# Altium footprint library Item_pcb.PcbLib: 282 footprints (part 9 of 18)
Each footprint in its own frame and in the unit in brackets; x right, y up, seen from the top. Pads: shape width x height; smd on the part's side, far side on the other; paste and mask are expansions set on the pad; w line width, h text height; cw(c..) or ccw(c..) is an arc to the next point about the centre after c.
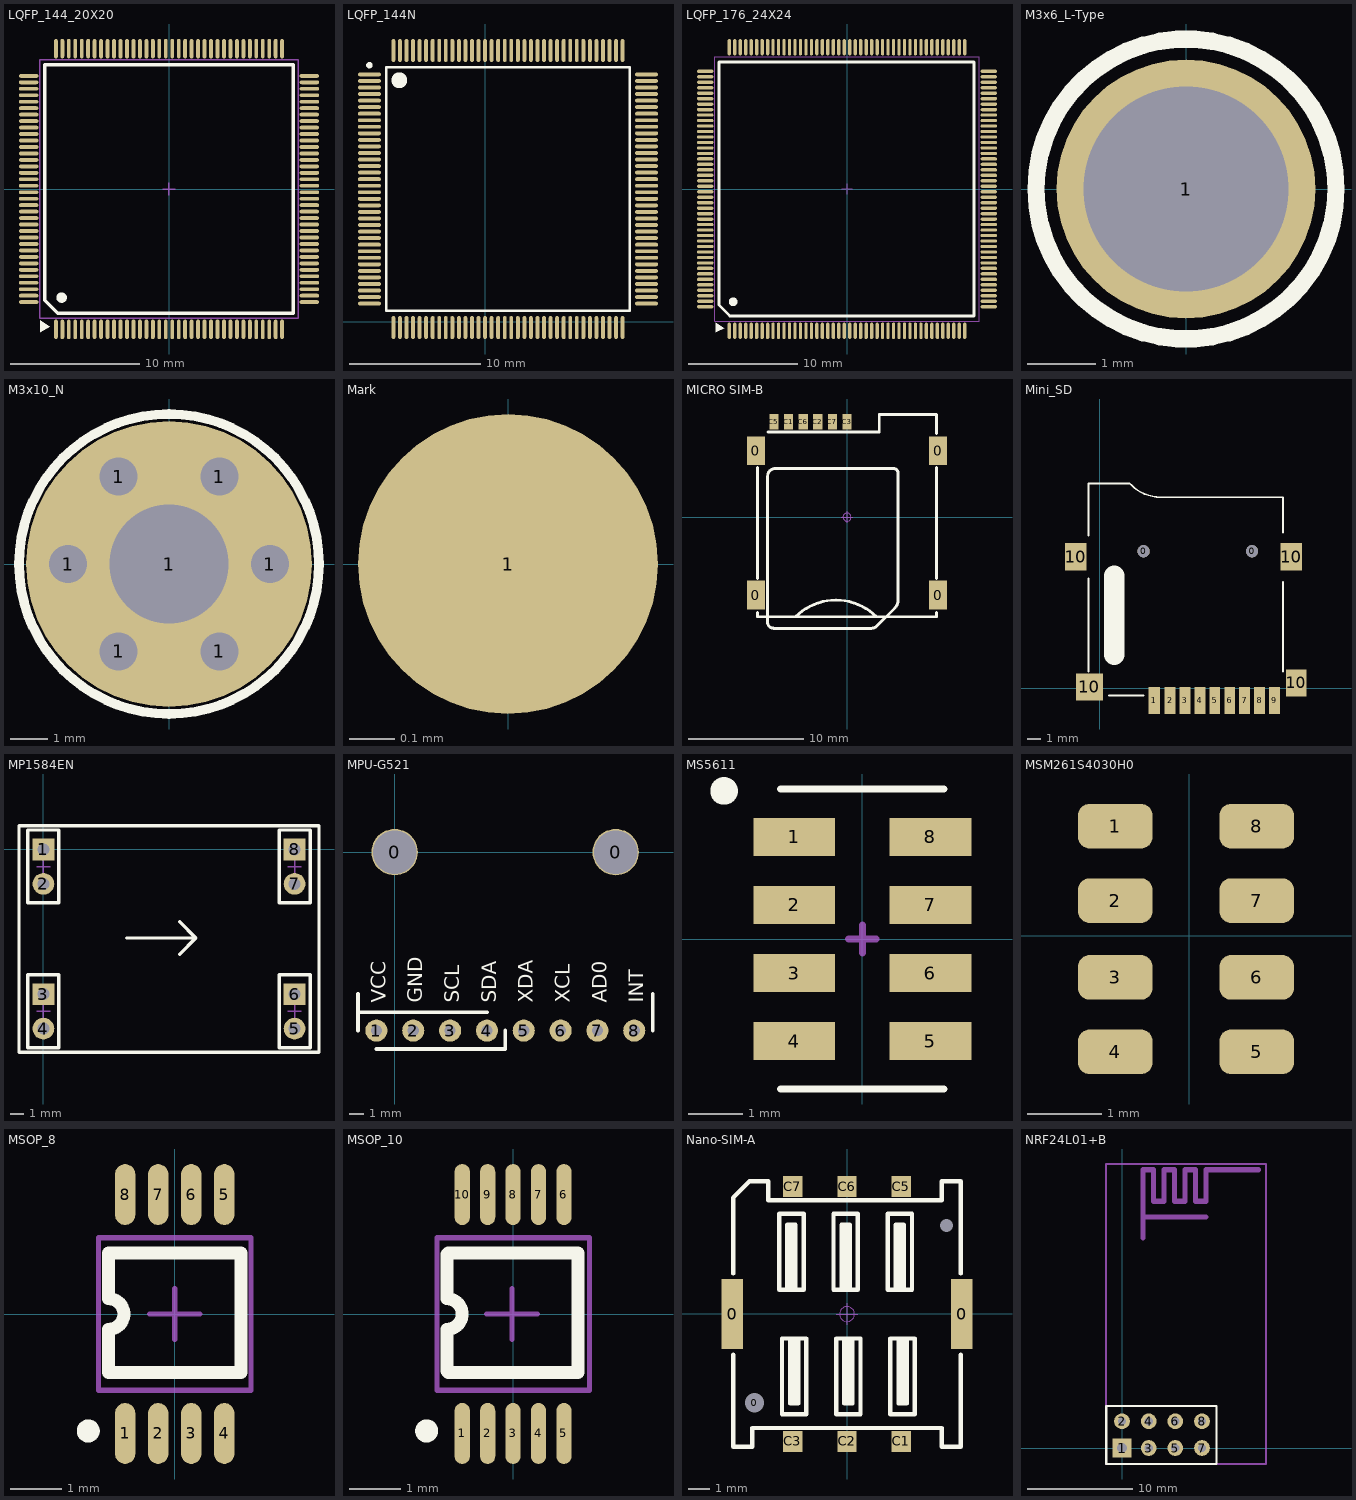
[diagram p8: the footprints below, top view; thin cyan lines are the x and y axes]

## LQFP_144_20X20 [mm]
pads (144):
  oval 0.3x1.5 smd: 1(-8.75,-10.85) 2(-8.25,-10.85) 3(-7.75,-10.85) 4(-7.25,-10.85) 5(-6.75,-10.85) 6(-6.25,-10.85) 7(-5.75,-10.85) 8(-5.25,-10.85) 9(-4.75,-10.85) 10(-4.25,-10.85) 11(-3.75,-10.85) 12(-3.25,-10.85) 13(-2.75,-10.85) 14(-2.25,-10.85) 15(-1.75,-10.85) 16(-1.25,-10.85) 17(-0.75,-10.85) 18(-0.25,-10.85) 19(0.25,-10.85) 20(0.75,-10.85) 21(1.25,-10.85) 22(1.75,-10.85) 23(2.25,-10.85) 24(2.75,-10.85) 25(3.25,-10.85) 26(3.75,-10.85) 27(4.25,-10.85) 28(4.75,-10.85) 29(5.25,-10.85) 30(5.75,-10.85) 31(6.25,-10.85) 32(6.75,-10.85) 33(7.25,-10.85) 34(7.75,-10.85) 35(8.25,-10.85) 36(8.75,-10.85) 73(8.75,10.85) 74(8.25,10.85) 75(7.75,10.85) 76(7.25,10.85) 77(6.75,10.85) 78(6.25,10.85) 79(5.75,10.85) 80(5.25,10.85) 81(4.75,10.85) 82(4.25,10.85) 83(3.75,10.85) 84(3.25,10.85) 85(2.75,10.85) 86(2.25,10.85) 87(1.75,10.85) 88(1.25,10.85) 89(0.75,10.85) 90(0.25,10.85) 91(-0.25,10.85) 92(-0.75,10.85) 93(-1.25,10.85) 94(-1.75,10.85) 95(-2.25,10.85) 96(-2.75,10.85) 97(-3.25,10.85) 98(-3.75,10.85) 99(-4.25,10.85) 100(-4.75,10.85) 101(-5.25,10.85) 102(-5.75,10.85) 103(-6.25,10.85) 104(-6.75,10.85) 105(-7.25,10.85) 106(-7.75,10.85) 107(-8.25,10.85) 108(-8.75,10.85)
  oval 1.5x0.3 smd: 37(10.85,-8.75) 38(10.85,-8.25) 39(10.85,-7.75) 40(10.85,-7.25) 41(10.85,-6.75) 42(10.85,-6.25) 43(10.85,-5.75) 44(10.85,-5.25) 45(10.85,-4.75) 46(10.85,-4.25) 47(10.85,-3.75) 48(10.85,-3.25) 49(10.85,-2.75) 50(10.85,-2.25) 51(10.85,-1.75) 52(10.85,-1.25) 53(10.85,-0.75) 54(10.85,-0.25) 55(10.85,0.25) 56(10.85,0.75) 57(10.85,1.25) 58(10.85,1.75) 59(10.85,2.25) 60(10.85,2.75) 61(10.85,3.25) 62(10.85,3.75) 63(10.85,4.25) 64(10.85,4.75) 65(10.85,5.25) 66(10.85,5.75) 67(10.85,6.25) 68(10.85,6.75) 69(10.85,7.25) 70(10.85,7.75) 71(10.85,8.25) 72(10.85,8.75) 109(-10.85,8.75) 110(-10.85,8.25) 111(-10.85,7.75) 112(-10.85,7.25) 113(-10.85,6.75) 114(-10.85,6.25) 115(-10.85,5.75) 116(-10.85,5.25) 117(-10.85,4.75) 118(-10.85,4.25) 119(-10.85,3.75) 120(-10.85,3.25) 121(-10.85,2.75) 122(-10.85,2.25) 123(-10.85,1.75) 124(-10.85,1.25) 125(-10.85,0.75) 126(-10.85,0.25) 127(-10.85,-0.25) 128(-10.85,-0.75) 129(-10.85,-1.25) 130(-10.85,-1.75) 131(-10.85,-2.25) 132(-10.85,-2.75) 133(-10.85,-3.25) 134(-10.85,-3.75) 135(-10.85,-4.25) 136(-10.85,-4.75) 137(-10.85,-5.25) 138(-10.85,-5.75) 139(-10.85,-6.25) 140(-10.85,-6.75) 141(-10.85,-7.25) 142(-10.85,-7.75) 143(-10.85,-8.25) 144(-10.85,-8.75)
Top Overlay:
  circle w0.4: c-8.3,-8.4 r0.2
  region: -9.225,-10.637 -9.975,-10.162 -9.975,-11.062
  lines w0.254: -9.6,-8.6 -8.6,-9.6 9.6,-9.6 9.6,9.6 -9.6,9.6 -9.6,-8.6
Mechanical 15:
  lines w0.1: -0.5,0 0.5,0 ; 0,-0.5 0,0.5 ; -10,-10 -10,10 10,10 10,-10 -10,-10
3D body "LQFP-144-20x20.STEP": height 1.88, standoff -0.01, extent -11.102,-11.1 11.1,11.102

## LQFP_144N [mm]
pads (144):
  oval 1.75x0.297 smd: 1(-8.82,18.868) 2(-8.82,18.368) 3(-8.82,17.868) 4(-8.82,17.368) 5(-8.82,16.868) 6(-8.82,16.368) 7(-8.82,15.868) 8(-8.82,15.368) 9(-8.82,14.868) 10(-8.82,14.368) 11(-8.82,13.868) 12(-8.82,13.368) 13(-8.82,12.868) 14(-8.82,12.368) 15(-8.82,11.868) 16(-8.82,11.368) 17(-8.82,10.868) 18(-8.82,10.368) 19(-8.82,9.868) 20(-8.82,9.368) 21(-8.82,8.868) 22(-8.82,8.368) 23(-8.82,7.868) 24(-8.82,7.368) 25(-8.82,6.868) 26(-8.82,6.368) 27(-8.82,5.868) 28(-8.82,5.368) 29(-8.82,4.868) 30(-8.82,4.368) 31(-8.82,3.868) 32(-8.82,3.368) 33(-8.82,2.868) 34(-8.82,2.368) 35(-8.82,1.868) 36(-8.82,1.368) 73(12.33,1.368) 74(12.33,1.868) 75(12.33,2.368) 76(12.33,2.868) 77(12.33,3.368) 78(12.33,3.868) 79(12.33,4.368) 80(12.33,4.868) 81(12.33,5.368) 82(12.33,5.868) 83(12.33,6.368) 84(12.33,6.868) 85(12.33,7.368) 86(12.33,7.868) 87(12.33,8.368) 88(12.33,8.868) 89(12.33,9.368) 90(12.33,9.868) 91(12.33,10.368) 92(12.33,10.868) 93(12.33,11.368) 94(12.33,11.868) 95(12.33,12.368) 96(12.33,12.868) 97(12.33,13.368) 98(12.33,13.868) 99(12.33,14.368) 100(12.33,14.868) 101(12.33,15.368) 102(12.33,15.868) 103(12.33,16.368) 104(12.33,16.868) 105(12.33,17.368) 106(12.33,17.868) 107(12.33,18.368) 108(12.33,18.868)
  oval 0.297x1.75 smd: 37(-6.995,-0.457) 38(-6.495,-0.457) 39(-5.995,-0.457) 40(-5.495,-0.457) 41(-4.995,-0.457) 42(-4.495,-0.457) 43(-3.995,-0.457) 44(-3.495,-0.457) 45(-2.995,-0.457) 46(-2.495,-0.457) 47(-1.995,-0.457) 48(-1.495,-0.457) 49(-0.995,-0.457) 50(-0.495,-0.457) 51(0.005,-0.457) 52(0.505,-0.457) 53(1.005,-0.457) 54(1.505,-0.457) 55(2.005,-0.457) 56(2.505,-0.457) 57(3.005,-0.457) 58(3.505,-0.457) 59(4.005,-0.457) 60(4.505,-0.457) 61(5.005,-0.457) 62(5.505,-0.457) 63(6.005,-0.457) 64(6.505,-0.457) 65(7.005,-0.457) 66(7.505,-0.457) 67(8.005,-0.457) 68(8.505,-0.457) 69(9.005,-0.457) 70(9.505,-0.457) 71(10.005,-0.457) 72(10.505,-0.457) 109(10.505,20.693) 110(10.005,20.693) 111(9.505,20.693) 112(9.005,20.693) 113(8.505,20.693) 114(8.005,20.693) 115(7.505,20.693) 116(7.005,20.693) 117(6.505,20.693) 118(6.005,20.693) 119(5.505,20.693) 120(5.005,20.693) 121(4.505,20.693) 122(4.005,20.693) 123(3.505,20.693) 124(3.005,20.693) 125(2.505,20.693) 126(2.005,20.693) 127(1.505,20.693) 128(1.005,20.693) 129(0.505,20.693) 130(0.005,20.693) 131(-0.495,20.693) 132(-0.995,20.693) 133(-1.495,20.693) 134(-1.995,20.693) 135(-2.495,20.693) 136(-2.995,20.693) 137(-3.495,20.693) 138(-3.995,20.693) 139(-4.495,20.693) 140(-4.995,20.693) 141(-5.495,20.693) 142(-5.995,20.693) 143(-6.495,20.693) 144(-6.995,20.693)
Top Overlay:
  circle w0.25: c-8.82,19.568 r0.125
  circle w0.6: c-6.545,18.418 r0.3
  lines w0.2: -7.545,0.818 -7.545,19.418 11.055,19.418 11.055,0.818 -7.545,0.818

## LQFP_176_24X24 [mm]
pads (176):
  oval 0.3x1.5 smd: 1(-10.75,-12.95) 2(-10.25,-12.95) 3(-9.75,-12.95) 4(-9.25,-12.95) 5(-8.75,-12.95) 6(-8.25,-12.95) 7(-7.75,-12.95) 8(-7.25,-12.95) 9(-6.75,-12.95) 10(-6.25,-12.95) 11(-5.75,-12.95) 12(-5.25,-12.95) 13(-4.75,-12.95) 14(-4.25,-12.95) 15(-3.75,-12.95) 16(-3.25,-12.95) 17(-2.75,-12.95) 18(-2.25,-12.95) 19(-1.75,-12.95) 20(-1.25,-12.95) 21(-0.75,-12.95) 22(-0.25,-12.95) 23(0.25,-12.95) 24(0.75,-12.95) 25(1.25,-12.95) 26(1.75,-12.95) 27(2.25,-12.95) 28(2.75,-12.95) 29(3.25,-12.95) 30(3.75,-12.95) 31(4.25,-12.95) 32(4.75,-12.95) 33(5.25,-12.95) 34(5.75,-12.95) 35(6.25,-12.95) 36(6.75,-12.95) 37(7.25,-12.95) 38(7.75,-12.95) 39(8.25,-12.95) 40(8.75,-12.95) 41(9.25,-12.95) 42(9.75,-12.95) 43(10.25,-12.95) 44(10.75,-12.95) 89(10.75,12.95) 90(10.25,12.95) 91(9.75,12.95) 92(9.25,12.95) 93(8.75,12.95) 94(8.25,12.95) 95(7.75,12.95) 96(7.25,12.95) 97(6.75,12.95) 98(6.25,12.95) 99(5.75,12.95) 100(5.25,12.95) 101(4.75,12.95) 102(4.25,12.95) 103(3.75,12.95) 104(3.25,12.95) 105(2.75,12.95) 106(2.25,12.95) 107(1.75,12.95) 108(1.25,12.95) 109(0.75,12.95) 110(0.25,12.95) 111(-0.25,12.95) 112(-0.75,12.95) 113(-1.25,12.95) 114(-1.75,12.95) 115(-2.25,12.95) 116(-2.75,12.95) 117(-3.25,12.95) 118(-3.75,12.95) 119(-4.25,12.95) 120(-4.75,12.95) 121(-5.25,12.95) 122(-5.75,12.95) 123(-6.25,12.95) 124(-6.75,12.95) 125(-7.25,12.95) 126(-7.75,12.95) 127(-8.25,12.95) 128(-8.75,12.95) 129(-9.25,12.95) 130(-9.75,12.95) 131(-10.25,12.95) 132(-10.75,12.95)
  oval 1.5x0.3 smd: 45(12.95,-10.75) 46(12.95,-10.25) 47(12.95,-9.75) 48(12.95,-9.25) 49(12.95,-8.75) 50(12.95,-8.25) 51(12.95,-7.75) 52(12.95,-7.25) 53(12.95,-6.75) 54(12.95,-6.25) 55(12.95,-5.75) 56(12.95,-5.25) 57(12.95,-4.75) 58(12.95,-4.25) 59(12.95,-3.75) 60(12.95,-3.25) 61(12.95,-2.75) 62(12.95,-2.25) 63(12.95,-1.75) 64(12.95,-1.25) 65(12.95,-0.75) 66(12.95,-0.25) 67(12.95,0.25) 68(12.95,0.75) 69(12.95,1.25) 70(12.95,1.75) 71(12.95,2.25) 72(12.95,2.75) 73(12.95,3.25) 74(12.95,3.75) 75(12.95,4.25) 76(12.95,4.75) 77(12.95,5.25) 78(12.95,5.75) 79(12.95,6.25) 80(12.95,6.75) 81(12.95,7.25) 82(12.95,7.75) 83(12.95,8.25) 84(12.95,8.75) 85(12.95,9.25) 86(12.95,9.75) 87(12.95,10.25) 88(12.95,10.75) 133(-12.95,10.75) 134(-12.95,10.25) 135(-12.95,9.75) 136(-12.95,9.25) 137(-12.95,8.75) 138(-12.95,8.25) 139(-12.95,7.75) 140(-12.95,7.25) 141(-12.95,6.75) 142(-12.95,6.25) 143(-12.95,5.75) 144(-12.95,5.25) 145(-12.95,4.75) 146(-12.95,4.25) 147(-12.95,3.75) 148(-12.95,3.25) 149(-12.95,2.75) 150(-12.95,2.25) 151(-12.95,1.75) 152(-12.95,1.25) 153(-12.95,0.75) 154(-12.95,0.25) 155(-12.95,-0.25) 156(-12.95,-0.75) 157(-12.95,-1.25) 158(-12.95,-1.75) 159(-12.95,-2.25) 160(-12.95,-2.75) 161(-12.95,-3.25) 162(-12.95,-3.75) 163(-12.95,-4.25) 164(-12.95,-4.75) 165(-12.95,-5.25) 166(-12.95,-5.75) 167(-12.95,-6.25) 168(-12.95,-6.75) 169(-12.95,-7.25) 170(-12.95,-7.75) 171(-12.95,-8.25) 172(-12.95,-8.75) 173(-12.95,-9.25) 174(-12.95,-9.75) 175(-12.95,-10.25) 176(-12.95,-10.75)
Top Overlay:
  circle w0.4: c-10.4,-10.3 r0.2
  region: -11.2,-12.7 -12,-12.2 -12,-13.1
  lines w0.254: -11.7,-10.6 -11.7,11.6 11.6,11.6 11.6,-11.6 -10.7,-11.6 -11.7,-10.6
Mechanical 15:
  lines w0.1: -0.5,0 0.5,0 ; 0,-0.5 0,0.5 ; -12.1,-12.1 12.1,-12.1 12.1,12.1 -12.1,12.1 -12.1,-12.1
3D body "LQFP-176-24X24.step": height 1.56, standoff -0.01, extent -12.892,-12.886 12.88,12.886

## M3x6_L-Type [mm] "M3铜柱，长：6mm"
pads (1):
  round 3.8 hole 3: 1(0,0)
Top Overlay:
  circle w0.254: c0,0 r2.2
3D body "M3x6.STEP": height 6.65, standoff 0.65, extent -2.698,-2.35 2.698,2.35
3D body "M3x8+6.STEP": height 8.55, standoff -5.45, extent -2.698,-2.35 2.698,2.35

## M3x10_N [mil] "M3铜柱，长：10mm"
pads (7):
  round 40 hole 40: 1(-106,0) 1(-53,-91.8) 1(-53,91.8) 1(53,-91.8) 1(53,91.8) 1(106,0)
  round 300 hole 125: 1(0,0)
Top Overlay:
  circle w10: c0,0 r157.48
3D body "M3x10.STEP": height 395.67, standoff 1.96, extent -106.22,-92.52 106.22,92.52

## Mark [mil]
pads (1):
  round 26 smd: 1(0,0)

## MICRO SIM-B [mm]
pads (10):
  rect 1.55x2.5 smd: 0(-7.9,-6.757) 0(-7.9,5.763) 0(7.9,-6.757) 0(7.9,5.763)
  rect 0.8x1.35 smd: C1(-5.07,8.268) C2(-2.53,8.268) C3(0.01,8.268) C5(-6.34,8.268) C6(-3.8,8.268) C7(-1.26,8.268)
Top Overlay:
  lines w0.254: -7.747,-8.255 -7.747,-8.636 7.747,-8.636 7.747,-8.255 ; -7.747,-5.334 -7.747,4.318 ; -6.858,7.366 2.794,7.366 2.794,8.89 7.747,8.89 7.747,7.239 ; -6.381,-9.636 2.136,-9.636 ccw(c2.136,-9.023) 2.57,-9.456 4.153,-7.873 ccw(c3.502,-7.223) 4.422,-7.223 4.422,-6.334 4.422,3.826 ccw(c4.041,3.826) 4.041,4.207 3.406,4.207 ; -6.381,-9.628 cw(c-6.381,-9.128) -6.881,-9.128 -6.881,3.572 cw(c-6.246,3.572) -6.246,4.207 3.787,4.207 ; -4.445,-8.636 cw(c-0.953,-12.128) 2.54,-8.636 ; 7.747,-5.334 7.747,4.318
Mechanical 15:
  circle w0.05: c0,0 r0.35
  lines w0.05: -0.5,0 0.5,0 ; 0,-0.5 0,0.5
3D body "MICRO SIM-B.STEP": height 1.4, standoff 0.03, extent -8.27,-8.5 8.27,8.72

## Mini_SD [mm]
pads (15):
  round 0.9 hole 0.9 unplated: 0(3.251,10.088) 0(11.251,10.088)
  rect 0.85x2 smd: 1(4.051,-0.912)
  rect 0.8x2 smd: 2(5.201,-0.912) 3(6.301,-0.912) 4(7.401,-0.912) 5(8.501,-0.912) 6(9.601,-0.912) 7(10.701,-0.912) 8(11.801,-0.912) 9(12.901,-0.912)
  rect 1.6x2 smd: 10(-1.749,9.688) 10(14.151,9.688)
  rect 2x2 smd: 10(-0.749,0.088)
  rect 1.5x2 smd: 10(14.501,0.388)
Top Overlay:
  lines w0.127: -0.814,11.231 -0.814,14.088 ; -0.814,13.771 -0.814,15.088 2.235,15.088 2.337,14.986 ccw(c4.505,17.154) 4.505,14.088 5.791,14.088 13.537,14.088 13.537,11.485 ; -0.811,1.226 -0.811,8.084 ; 13.54,1.226 13.54,7.83
  lines w0.15: 0.713,-0.552 3.253,-0.552
  lines w1.5: 1.092,2.468 1.092,8.31
3D body "User Library-Micro SD.STEP": height 2.07, standoff -0.4, extent -2.002,-1.152 14.304,14.058

## MP1584EN [mm] "MODE"
pads (8):
  rect 1.6x1.6 hole 0.9: 1(0,0) 3(0,-10.66) 6(18.5,-10.66) 8(18.5,0)
  round 1.6 hole 0.9: 2(0,-2.54) 4(0,-13.2) 5(18.5,-13.2) 7(18.5,-2.54)
Top Overlay:
  lines w0.254: 6.147,-6.528 11.227,-6.528 ; 10.033,-7.722 11.227,-6.528 ; 10.033,-5.334 11.227,-6.528 ; -1.8,-14.95 20.3,-14.95 20.3,1.75 -1.8,1.75 -1.8,-14.95 ; -1.143,-14.597 1.143,-14.597 1.143,-9.23 -1.143,-9.23 -1.143,-14.597 ; -1.143,-3.937 1.143,-3.937 1.143,1.43 -1.143,1.43 -1.143,-3.937 ; 17.357,-14.597 19.643,-14.597 19.643,-9.23 17.357,-9.23 17.357,-14.597 ; 17.357,-3.937 19.643,-3.937 19.643,1.43 17.357,1.43 17.357,-3.937
Mechanical 15:
  lines w0.1: -0.5,-11.93 0.5,-11.93 ; -0.5,-1.27 0.5,-1.27 ; 0,-12.43 0,-11.43 ; 0,-1.77 0,-0.77 ; 18,-11.93 19,-11.93 ; 18,-1.27 19,-1.27 ; 18.5,-12.43 18.5,-11.43 ; 18.5,-1.77 18.5,-0.77
3D body: height 12.9, standoff 12.2, extent -1.8,-14.95 20.3,1.75
3D body "Header-F-2.54X2.stp": height 8.5, standoff -3.2, extent 17.25,-14.595 19.75,-9.265
3D body "Header-F-2.54X2.stp": height 8.6, standoff -3.1, extent 17.25,-3.935 19.75,1.395
3D body "Header-F-2.54X2.stp": height 8.5, standoff -3.2, extent -1.25,-14.595 1.25,-9.265
3D body "Header-F-2.54X2.stp": height 8.6, standoff -3.1, extent -1.25,-3.935 1.25,1.395
3D body "Capacitor 1206 SMD1.step": height 14, standoff 13, extent 17.7,-8.2 19.3,-5
3D body "Capacitor 1206 SMD1.step": height 14, standoff 13, extent -0.8,-8.2 0.8,-5
3D body "MSOP-8.STEP": height 14.15, standoff 13, extent 4.647,-8.978 7.647,-4.078
3D body "DI-214AA(SMB).step": height 15.45, standoff 13.03, extent 2.279,-2.865 7.779,1.035
3D body "HEADER 2.54X2.stp": height -4.3, standoff -15.5, extent -1.27,-3.937 1.229,1.143
3D body "HEADER 2.54X2.stp": height -4.3, standoff -15.5, extent -1.27,-14.597 1.229,-9.517
3D body "HEADER 2.54X2.stp": height -4.3, standoff -15.5, extent 17.23,-14.597 19.729,-9.517
3D body "HEADER 2.54X2.stp": height -4.3, standoff -15.5, extent 17.23,-3.937 19.729,1.143
3D body "Iductor-CDRH-74.step": height 17.3, standoff 12.8, extent 8.822,-9.715 16.222,-1.715

## MPU-G521 [mil]
pads (10):
  round 125.98 hole 118.11: 0(0,0) 0(600,0)
  round 60 hole 30: 1(-49.61,-484.25) 2(50.39,-484.25) 3(150.39,-484.25) 4(250.39,-484.25) 5(350.39,-484.25) 6(450.39,-484.25) 7(550.39,-484.25) 8(650.39,-484.25)
Top Overlay:
  lines w10: -99.61,-484.25 -99.61,-384.25 ; -99.61,-434.25 250.39,-434.25 ; -49.61,-534.25 300.39,-534.25 300.39,-484.25 ; 700.39,-484.25 700.39,-384.25
  text "INT" at 675.39,-409.25 h39.37
  text "SDA" at 275.39,-409.25 h39.37
  text "SCL" at 175.39,-409.25 h39.37
  text "GND" at 75.39,-409.25 h39.37
  text "VCC" at -24.61,-409.25 h39.37
  text "XDA" at 375.39,-409.25 h39.37
  text "XCL" at 475.39,-409.25 h39.37
  text "AD0" at 575.39,-409.25 h39.37
3D body "CAP-R.STEP": height 486.03, standoff 432.88, extent 256.1,-2.59 344.69,50.56
3D body "Header-F-2.54X8.stp": height 338.58, standoff -122.05, extent -104.53,-533.86 705.31,-435.43
3D body "QFN24-4X4.STEP": height 490.16, standoff 450.79, extent 221.27,-295.66 379.53,-137.4
3D body "M3x11+6.STEP": height -17.71, standoff -687.01, extent 493.77,-92.52 706.22,92.52
3D body "M3x11+6.STEP": height -17.71, standoff -687.01, extent -106.23,-92.52 106.22,92.52
3D body: height 452.76, standoff 433.07, extent -99.61,-531.5 696.85,98.43
3D body "M3x4.STEP": height 651.58, standoff 494.09, extent 493.78,-92.51 706.23,92.52
3D body "User Library-0603 SMD Capacitor.STEP": height 464.65, standoff 452.76, extent -98.49,-98.74 -35.49,-67.25
3D body "SOT23-5R.STEP": height 503.94, standoff 452.76, extent -83.66,-295.05 34.45,-176.94

## MS5611 [mm] "气压传感芯片"
pads (8):
  rect 1.5x0.7 smd: 1(-1.25,1.875) 2(-1.25,0.625) 3(-1.25,-0.625) 4(-1.25,-1.875) 5(1.25,-1.875) 6(1.25,-0.625) 7(1.25,0.625) 8(1.25,1.875)
Top Overlay:
  circle w0.454: c-2.54,2.718 r0.025
  lines w0.127: -1.5,-2.754 1.5,-2.754 ; -1.5,2.754 1.5,2.754
Mechanical 15:
  lines w0.127: -0.254,0 0.254,0 ; 0,-0.254 0,0.254
3D body "SM5611.STEP": height 1, standoff -0.01, extent -1.5,-2.5 1.501,2.5

## MSM261S4030H0 [mm]
pads (8):
  rrect50% 1x0.6 smd: 1(-0.991,1.473) 2(-0.991,0.473) 3(-0.991,-0.559) 4(-0.991,-1.559) 5(0.909,-1.559) 6(0.909,-0.559) 7(0.909,0.473) 8(0.909,1.473)
3D body "Maix_GO.stp": height 1.06, standoff 0, extent -1.526,-2.048 1.474,1.952

## MSOP_8 [mm]
pads (8):
  oval 0.4x1.2 smd: 1(-0.975,-2.35) 2(-0.325,-2.35) 3(0.325,-2.35) 4(0.975,-2.35) 5(0.975,2.35) 6(0.325,2.35) 7(-0.325,2.35) 8(-0.975,2.35)
Top Overlay:
  circle w0.254: c-1.7,-2.3 r0.1
  lines w0.254: -1.3,-1.15 -1.3,-0.3 ccw(c-1.3,0) -1.3,0.3 -1.3,1.2 1.3,1.2 1.3,-1.15 -1.3,-1.15
Mechanical 15:
  lines w0.1: -0.5,0 0.5,0 ; 0,-0.5 0,0.5 ; -1.5,-1.5 -1.5,1.5 1.5,1.5 1.5,-1.5 -1.5,-1.5
3D body "MSOP-8.STEP": height 1.15, standoff 0, extent -1.5,-2.45 1.5,2.45

## MSOP_10 [mm]
pads (10):
  oval 0.3x1.2 smd: 1(-1,-2.35) 2(-0.5,-2.35) 3(0,-2.35) 4(0.5,-2.35) 5(1,-2.35) 6(1,2.35) 7(0.5,2.35) 8(0,2.35) 9(-0.5,2.35) 10(-1,2.35)
Top Overlay:
  circle w0.254: c-1.7,-2.3 r0.1
  lines w0.254: -1.3,-1.125 -1.3,-0.3 ccw(c-1.3,0) -1.3,0.3 -1.3,1.175 -1.275,1.2 1.275,1.2 1.275,-1.15 -1.275,-1.15 -1.3,-1.125
Mechanical 15:
  lines w0.1: -0.525,0 0.475,0 ; -0.025,-0.5 -0.025,0.5 ; -1.5,-1.5 -1.5,1.5 1.5,1.5 1.5,-1.5 -1.5,-1.5
3D body "MSOP-10.STEP": height 1.25, standoff 0, extent -1.5,-2.514 1.5,2.386

## Nano-SIM-A [mm]
pads (10):
  rect 1x3.29 smd: 0(-5.385,-0.025) 0(5.385,-0.025)
  round 0.6 hole 0.9: 0(-4.34,-4.175)
  round 0 hole 0.6: 0(4.66,4.125)
  rect 0.9x1 smd: C1(2.54,-5.995) C2(0,-5.995) C3(-2.54,-5.995) C5(2.54,5.955) C6(0,5.955) C7(-2.54,5.955)
Top Overlay:
  lines w0.203: -5.334,-1.93 -5.334,-6.248 -4.445,-6.248 -4.445,-5.359 4.445,-5.359 4.445,-6.248 5.334,-6.248 5.334,-1.93 ; -5.334,1.88 -5.334,5.436 -4.572,6.198 -3.683,6.198 -3.683,5.309 4.445,5.309 4.445,6.198 5.334,6.198 5.334,1.88 ; -2.794,1.118 -2.794,4.166 -2.413,4.166 -2.413,1.118 ; -2.667,-1.168 -2.667,-4.216 -2.286,-4.216 -2.286,-1.168 ; -2.667,1.118 -2.667,4.039 ; -2.54,-4.216 -2.54,-1.168 ; -2.54,1.118 -2.54,4.166 ; -2.413,-4.089 -2.413,-1.168 ; -0.254,1.118 -0.254,4.166 0.127,4.166 0.127,1.118 ; -0.127,-1.168 -0.127,-4.216 0.254,-4.216 0.254,-1.168 ; -0.127,1.118 -0.127,4.039 ; 0,-4.216 0,-1.168 ; 0,1.118 0,4.166 ; 0.127,-4.089 0.127,-1.168 ; 2.286,1.118 2.286,4.166 2.667,4.166 2.667,1.118 ; 2.413,-1.168 2.413,-4.216 2.794,-4.216 2.794,-1.168 ; 2.413,1.118 2.413,4.039 ; 2.54,-4.216 2.54,-1.168 ; 2.54,1.118 2.54,4.166 ; 2.667,-4.089 2.667,-1.168 ; -3.175,1.118 -2.032,1.118 -2.032,4.674 -3.175,4.674 -3.175,1.118 ; -3.048,-4.724 -1.905,-4.724 -1.905,-1.168 -3.048,-1.168 -3.048,-4.724 ; -0.635,1.118 -0.635,4.674 0.508,4.674 0.508,1.118 -0.635,1.118 ; -0.508,-4.724 0.635,-4.724 0.635,-1.168 -0.508,-1.168 -0.508,-4.724 ; 1.905,1.118 1.905,4.674 3.048,4.674 3.048,1.118 1.905,1.118 ; 2.032,-4.724 2.032,-1.168 3.175,-1.168 3.175,-4.724 2.032,-4.724
Mechanical 15:
  circle w0.05: c0,-0.025 r0.35
  lines w0.05: -0.5,-0.025 0.5,-0.025 ; 0,-0.525 0,0.475
3D body "Nano-SIM-A.STEP": height 1.45, standoff -0.25, extent -5.685,-6.175 5.685,6.125

## NRF24L01+B [mm] "2.4G无线模块"
pads (8):
  rect 1.8x1.8 hole 1: 1(0,0)
  round 1.5 hole 0.8: 2(0,2.54) 3(2.54,0) 4(2.54,2.54) 5(5.08,0) 6(5.08,2.54) 7(7.62,0) 8(7.62,2.54)
Top Overlay:
  lines w0.203: -1.5,-1.5 -1.5,4 9,4 9,-1.524 -1.476,-1.524 -1.5,-1.5
Mechanical 15:
  lines w0.203: -1.524,-1.524 13.716,-1.524 13.716,27.051 -1.524,27.051 -1.524,-1.524
  lines w0.5: 2,20 2,26.5 3,26.5 3,23.5 4,23.5 4,26.5 5,26.5 5,23.5 6,23.5 6,26.5 7,26.5 7,23.5 8,23.5 8,26.5 13,26.5 ; 2,22 8,22
3D body "NRF24L01+B.STEP": height 15.44, standoff -3.03, extent -1.5,-1.5 13.7,27